# Altium footprint library Cty1.PcbLib: 870 footprints (part 7 of 55)
Each footprint in its own frame and in the unit in brackets; x right, y up, seen from the top. Pads: shape width x height; smd on the part's side, far side on the other; paste and mask are expansions set on the pad; w line width, h text height; cw(c..) or ccw(c..) is an arc to the next point about the centre after c.
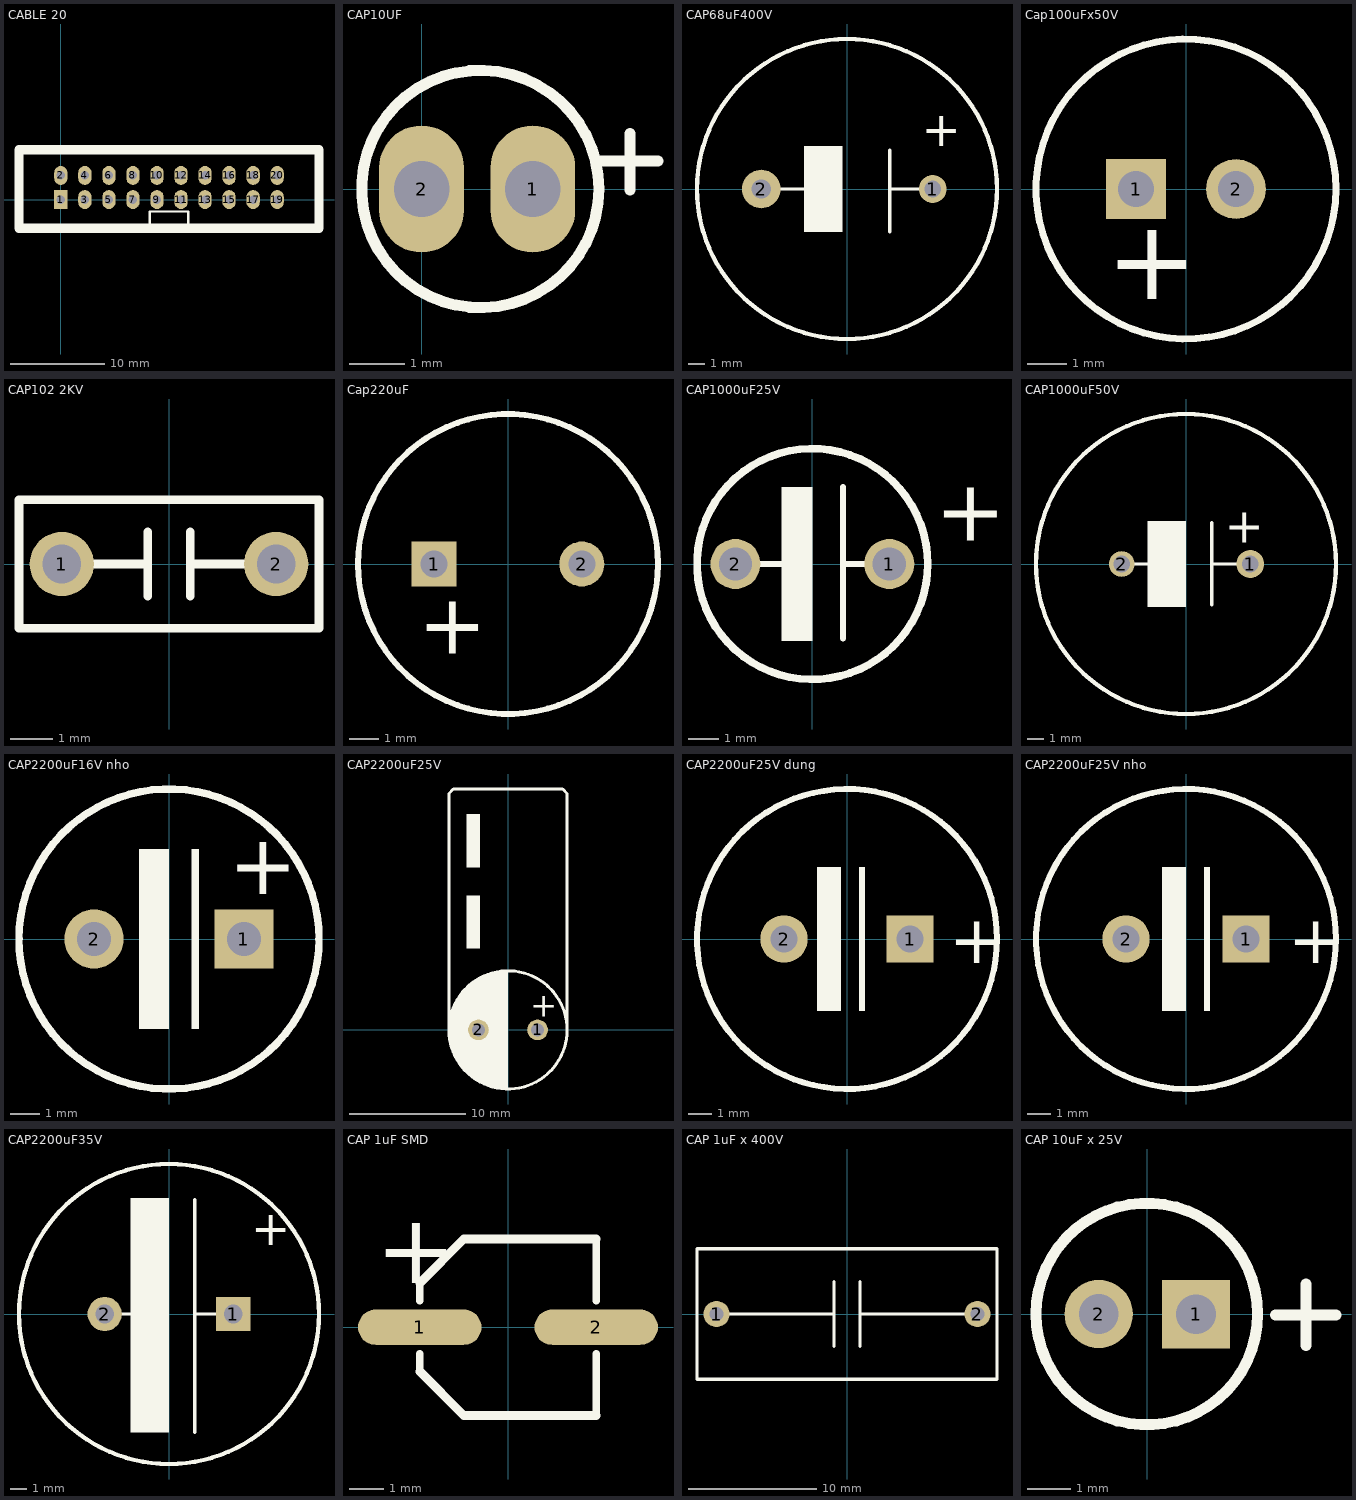
[diagram p6: the footprints below, top view; thin cyan lines are the x and y axes]

## CABLE 20 [mm] "Connector; Header; 5x2 Position"
pads (20):
  rect 1.4x2 hole 0.9: 1(0,0)
  oval 1.4x2 hole 0.9: 2(0,2.54) 3(2.54,0) 4(2.54,2.54) 5(5.08,0) 6(5.08,2.54) 7(7.62,0) 8(7.62,2.54) 9(10.16,0) 10(10.16,2.54) 11(12.7,0) 12(12.7,2.54) 13(15.24,0) 14(15.24,2.54) 15(17.78,0) 16(17.78,2.54) 17(20.32,0) 18(20.32,2.54) 19(22.86,0) 20(22.86,2.54)
Top Overlay:
  lines w0.254: 9.398,-2.54 9.398,-1.27 13.462,-1.27 13.462,-2.794
  lines w1: 8.28,-3.048 27.28,-3.048 27.28,5.27 8.28,5.27 ; 14.58,-3.048 -4.42,-3.048 -4.42,5.27 14.58,5.27
3D body "User Library-HDB-20.step": height 9.3, standoff -2.5, extent -5.02,-3.63 27.88,5.77

## CAP10UF [mil]
pads (2):
  oval 60x90 hole 39.37 unplated: 1(78.74,0) 2(0,0)
Top Overlay:
  circle w7.87: c41.57,0 r83.99
  lines w7.87: 127.32,19.68 167.32,19.68 ; 147.64,-0.63 147.64,39.37

## CAP68uF400V [mil]
pads (2):
  round 65 hole 39.37: 1(200,0)
  round 90 hole 45: 2(-200,0)
Top Overlay:
  circle w10: c0,0 r350
  rectangle: -100,-100 -10,100
  lines w7.87: -170.94,0 -100,0 ; 100,-100 100,91 ; 100,0 170,0
  text "+" at 175,100 h80

## Cap100uFx50V [mil] "Capacitor, tu loc nguon 100uF"
height 649.61
pads (2):
  rect 60x60 hole 36: 1(-50,0)
  round 60 hole 36: 2(50,0)
Top Overlay:
  circle w7: c0,0 r150
  text "+" at -80,-110 h80

## CAP102 2KV [mil] "Capacitor, Ceramic, Thru-Hole, Dipped Radial; Body 5.1 x 3.2 mm (WxT) Pin Spacing 2.54 mm (typ)"
pads (2):
  round 60 hole 36: 1(-100,0) 2(100,0)
Top Overlay:
  lines w8: -70,0 -20,0 ; -20,-30 -20,30 ; 20,-30 20,30 ; 20,0 70,0 ; -140,-60 -140,60 140,60 140,-60 -140,-60

## Cap220uF [mil] "Capacitor, tu loc nguon 220uF"
height 649.61
pads (2):
  rect 60x60 hole 36: 1(-98.4,0)
  round 60 hole 36: 2(98.4,0)
Top Overlay:
  circle w7.87: c0,0 r200
  text "+" at -120,-120 h80

## CAP1000uF25V [mil]
pads (2):
  round 65 hole 43.31: 1(100,0) 2(-100,0)
Top Overlay:
  circle w10: c0,0 r150
  rectangle: -40,-100 0,100
  lines w7.87: -70.94,0 -20,0 ; 40,-96.85 40,100 ; 41.06,0 70,0
  text "+" at 160,30 h80

## CAP1000uF50V [mil]
pads (2):
  round 65 hole 39.37: 1(150,0)
  round 60 hole 39.37: 2(-150,0)
Top Overlay:
  circle w10: c0,0 r350
  rectangle: -90,-100 0,100
  lines w7.87: -120.94,0 -70,0 ; 60,-95 60,96 ; 61.06,0 120,0
  text "+" at 90,50 h80

## CAP2200uF16V nho [mm] "2200uFX16V loai nho"
height 20.32
pads (2):
  rect 2x2 hole 1.143: 1(2.54,0)
  round 2 hole 1.143: 2(-2.54,0)
Top Overlay:
  circle w0.254: c0,0 r5.08
  rectangle: 0.762,-3.048 1.016,3.048
  rectangle: -1.016,-3.048 0,3.048
  text "+" at 2.032,1.524 h2.03

## CAP2200uF25V [mil] "2200uFX25V"
pads (2):
  round 70 hole 43.31: 1(100,0) 2(-100,0)
Top Overlay:
  circle w10: c0,0 r200
  rectangle: -50,-195 0,195
  rectangle: -100,-110 -40,100
  rectangle: -140,550 -95,730
  region: -95,455 -140,455 -140,275 -95,275
  lines w10: -200,-5 -200,800 -185,815 185,815 200,800 200,0
  lines w100: -54.85,139.61 ccw(c0,0) -50.45,-141.26
  text "+" at 75,45 h80

## CAP2200uF25V dung [mil] "2200uFX25V dung"
height 500
pads (2):
  rect 78.74x78.74 hole 45: 1(105,0)
  round 78.74 hole 45: 2(-105,0)
Top Overlay:
  circle w10: c0,0 r250
  rectangle: 20,-120 30,120
  rectangle: -50,-120 -10,120
  text "+" at 170,-40 h80

## CAP2200uF25V nho [mm] "2200uFX25V loai nho"
height 20.32
pads (2):
  rect 2x2 hole 1.143: 1(2.54,0)
  round 2 hole 1.143: 2(-2.54,0)
Top Overlay:
  circle w0.254: c0,0 r6.35
  rectangle: 0.762,-3.048 1.016,3.048
  rectangle: -1.016,-3.048 0,3.048
  text "+" at 4.318,-1.016 h2.03

## CAP2200uF35V [mil]
pads (2):
  rect 80x80 hole 43.31: 1(150,0)
  round 80 hole 43.31: 2(-150,0)
Top Overlay:
  circle w10: c0,0 r350
  rectangle: -90,-277 0,271
  lines w7.87: -120.94,0 -70,0 ; 60,-276 60,267 ; 61.06,0 120,0
  text "+" at 192,161 h80

## CAP 1uF SMD [mil] "TU SMD"
pads (2):
  oval 140x40 smd: 1(-100,0) 2(100,0)
Top Overlay:
  lines w8: -100,-50 -100,-30 ; -100,30 -100,50 ; 100,-100 100,-30 ; 100,30 100,100
  lines w10: -100,-50 -50,-100 100,-100 ; -100,50 -50,100 50,100 100,100
  text "+" at -150,50 h80

## CAP 1uF x 400V [mil] "Capacitor, tu khong phan cuc 1uF 400V"
pads (2):
  round 80 hole 43.31: 1(-400,0) 2(400,0)
Top Overlay:
  lines w10: -360,0 -40,0 ; -40,-100 -40,100 ; 40,-100 40,100 ; 40,0 360,0 ; -460,-200 460,-200 460,200 -460,200 -460,-200

## CAP 10uF x 25V [mil]
pads (2):
  rect 62x62 hole 36: 1(44.18,-0.1)
  round 62 hole 36: 2(-44.18,0.1)
Top Overlay:
  circle w10: c-0.51,0.1 r100.64
  lines w10: 116.45,-0.62 171.3,-0.62 ; 144.27,-28.71 144.27,27.2